# Altium footprint library Nanjar's Library.PcbLib: 153 footprints (part 7 of 10)
Each footprint in its own frame and in the unit in brackets; x right, y up, seen from the top. Pads: shape width x height; smd on the part's side, far side on the other; paste and mask are expansions set on the pad; w line width, h text height; cw(c..) or ccw(c..) is an arc to the next point about the centre after c.
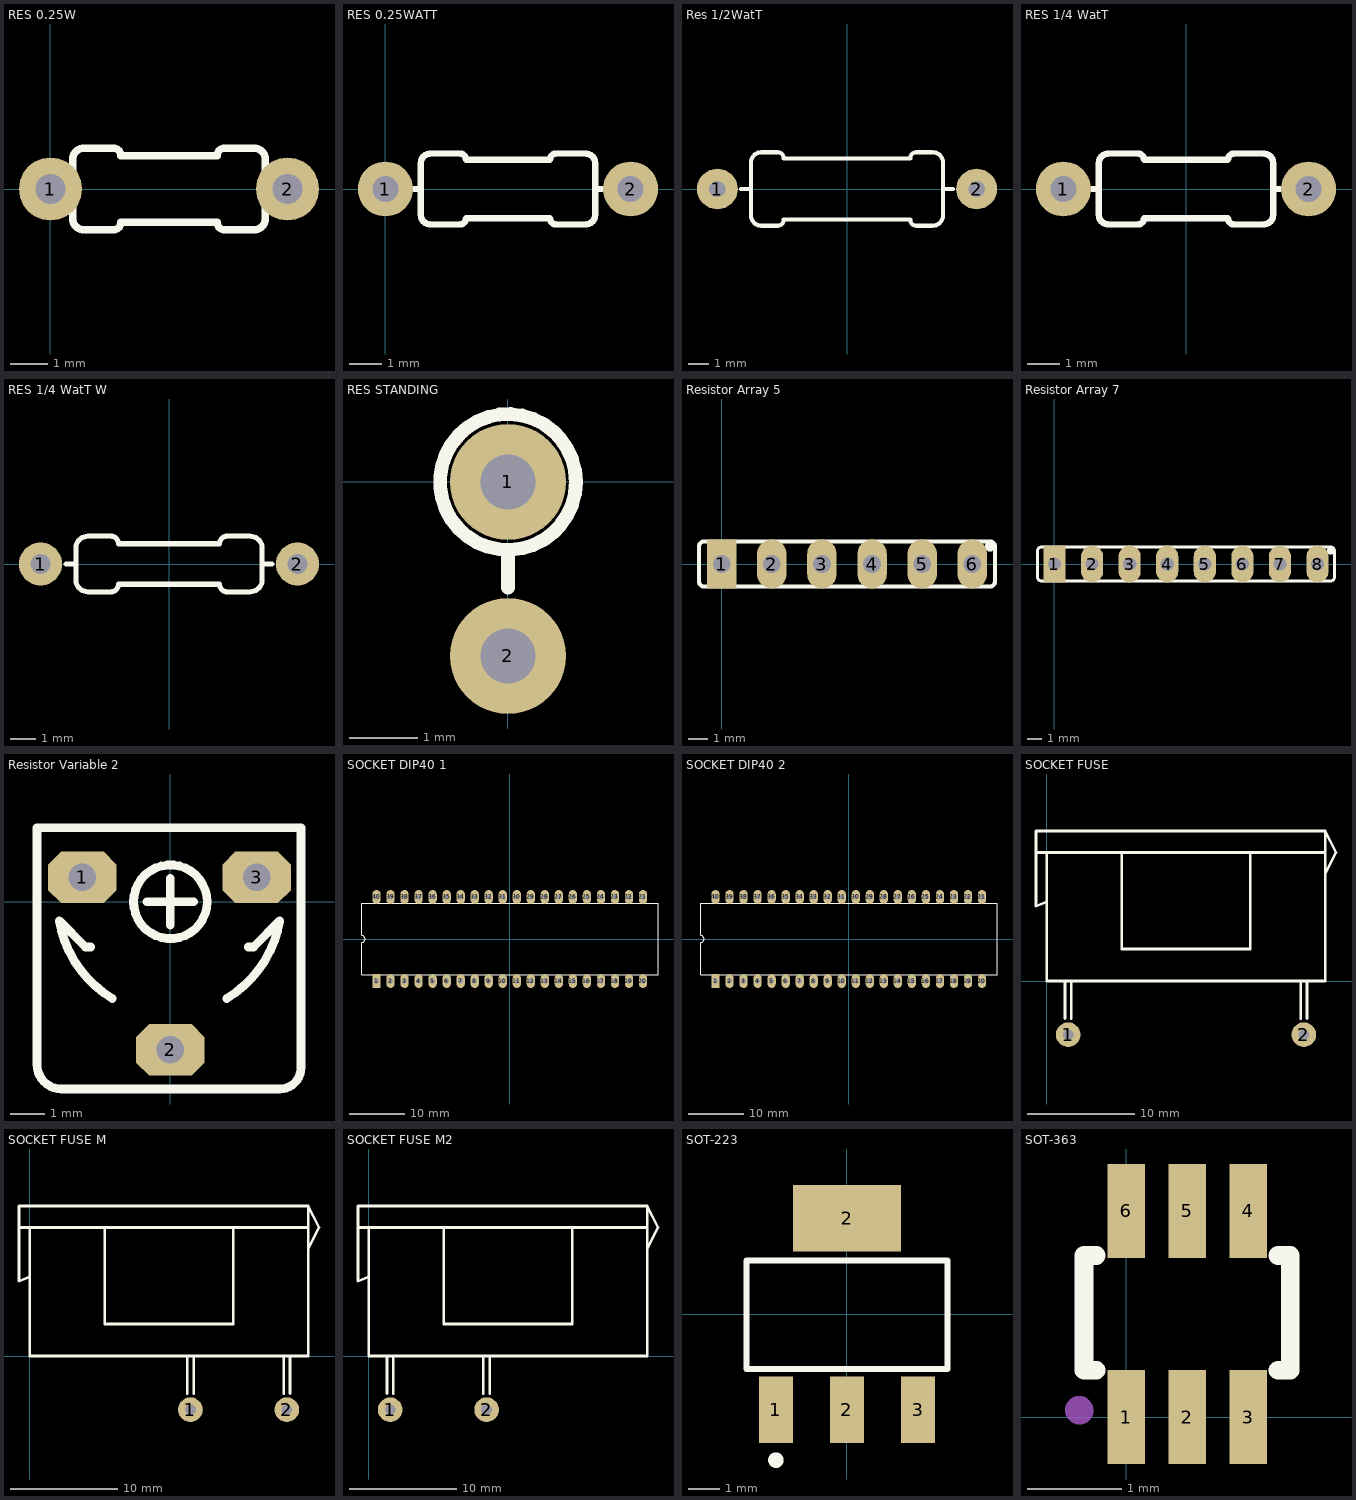
[diagram p6: the footprints below, top view; thin cyan lines are the x and y axes]

## RES 0.25W [mm]
pads (2):
  round 1.7 hole 0.8: 1(0,0) 2(6.4,0)
Top Overlay:
  lines w0.2: 0.4,0 0.6,0 ; 6,0 5.8,0 ; 0.6,0 0.6,-0.8 ccw(c0.9,-0.8) 0.9,-1.1 1.7,-1.1 ccw(c1.7,-0.9) 1.9,-0.9 3.2,-0.9 4.5,-0.9 ccw(c4.7,-0.9) 4.7,-1.1 5.5,-1.1 ccw(c5.5,-0.8) 5.8,-0.8 5.8,0 ; 0.6,0 0.6,0.8 cw(c0.9,0.8) 0.9,1.1 1.7,1.1 cw(c1.7,0.9) 1.9,0.9 3.2,0.9 4.5,0.9 cw(c4.7,0.9) 4.7,1.1 5.5,1.1 cw(c5.5,0.8) 5.8,0.8 5.8,0
3D body "SW3dPS-Res_Normal (0.25W).STEP": height 1.92, standoff -2, extent -0.229,-0.92 6.629,0.921

## RES 0.25WATT [mm]
pads (2):
  round 1.7 hole 0.8: 1(0,0) 2(7.6,0)
Top Overlay:
  lines w0.2: 1.1,0 0.9,0 1.1,0 ; 1.1,0 1.1,0.8 cw(c1.4,0.8) 1.4,1.1 2.3,1.1 cw(c2.3,0.9) 2.5,0.9 3.8,0.9 5.1,0.9 cw(c5.3,0.9) 5.3,1.1 6.2,1.1 cw(c6.2,0.8) 6.5,0.8 6.5,0 ; 1.1,0 1.1,-0.8 ccw(c1.4,-0.8) 1.4,-1.1 2.3,-1.1 ccw(c2.3,-0.9) 2.5,-0.9 3.8,-0.9 5.1,-0.9 ccw(c5.3,-0.9) 5.3,-1.1 6.2,-1.1 ccw(c6.2,-0.8) 6.5,-0.8 6.5,0 ; 6.5,0 6.7,0 6.5,0
3D body "Assem1.STEP": height 0, standoff 0, extent 0.585,-0.978 0.585,-0.978
3D body "My 0.25watt.step": height 2.43, standoff -2.14, extent -0.3,-1.15 7.9,1.15

## Res 1/2WatT [mm]
pads (2):
  round 2 hole 0.8: 1(-6.35,0) 2(6.35,0)
Top Overlay:
  lines w0.2: -4.7,0 -4.7,1.3 cw(c-4.2,1.3) -4.2,1.8 -3.4,1.8 cw(c-3.4,1.5) -3.1,1.5 0,1.5 3.1,1.5 cw(c3.4,1.5) 3.4,1.8 4.2,1.8 cw(c4.2,1.3) 4.7,1.3 4.7,0 ; -4.7,0 -5.2,0 -4.7,0 ; -4.7,0 -4.7,-1.3 ccw(c-4.2,-1.3) -4.2,-1.8 -3.4,-1.8 ccw(c-3.4,-1.5) -3.1,-1.5 0,-1.5 3.1,-1.5 ccw(c3.4,-1.5) 3.4,-1.8 4.2,-1.8 ccw(c4.2,-1.3) 4.7,-1.3 4.7,0 ; 4.7,0 5.2,0 4.7,0
3D body "User Library-Res50-Axial 0_5W-1_5M.step": height 3.78, standoff -5.6, extent -6.725,-1.875 6.725,1.875

## RES 1/4 WatT [mm]
pads (2):
  round 1.7 hole 0.8: 1(-3.8,0) 2(3.8,0)
Top Overlay:
  lines w0.2: -2.7,0 -2.9,0 -2.7,0 ; -2.7,0 -2.7,0.8 cw(c-2.4,0.8) -2.4,1.1 -1.5,1.1 cw(c-1.5,0.9) -1.3,0.9 0,0.9 1.3,0.9 cw(c1.5,0.9) 1.5,1.1 2.4,1.1 cw(c2.4,0.8) 2.7,0.8 2.7,0 ; -2.7,0 -2.7,-0.8 ccw(c-2.4,-0.8) -2.4,-1.1 -1.5,-1.1 ccw(c-1.5,-0.9) -1.3,-0.9 0,-0.9 1.3,-0.9 ccw(c1.5,-0.9) 1.5,-1.1 2.4,-1.1 ccw(c2.4,-0.8) 2.7,-0.8 2.7,0 ; 2.7,0 2.9,0 2.7,0
3D body "Assem1.STEP": height 0, standoff 0, extent -3.215,-0.978 -3.215,-0.978
3D body "User Library-res-7_62-0r.step": height 2.45, standoff -1.75, extent -4.1,-1.2 4.12,1.206

## RES 1/4 WatT W [mm]
pads (2):
  round 1.7 hole 0.8: 1(-5.08,0) 2(5.08,0)
Top Overlay:
  lines w0.2: -3.683,0 -4.064,0 -3.683,0 ; -3.683,0 -3.683,-0.635 ccw(c-3.209,-0.626) -3.2,-1.1 -2.3,-1.1 ccw(c-2.3,-0.8) -2,-0.8 0,-0.8 2,-0.8 ccw(c2.3,-0.8) 2.3,-1.1 3.2,-1.1 ccw(c3.209,-0.626) 3.683,-0.635 3.683,0 ; -3.683,0 -3.683,0.635 cw(c-3.209,0.626) -3.2,1.1 -2.3,1.1 cw(c-2.3,0.8) -2,0.8 0,0.8 2,0.8 cw(c2.3,0.8) 2.3,1.1 3.2,1.1 cw(c3.209,0.626) 3.683,0.635 3.683,0 ; 3.683,0 4.064,0 3.683,0
3D body "User Library-Res40-Axial 0_25W-1K.step": height 2.41, standoff -2, extent -5.38,-1.2 5.38,1.2
3D body "Assem1.STEP": height 0, standoff 0, extent -3.215,-0.978 -3.215,-0.978

## RES STANDING [mm]
pads (2):
  round 1.7 hole 0.8: 1(0,0) 2(0,-2.55)
Top Overlay:
  circle w0.2: c0,0 r0.996
  lines w0.2: 0,-1.55 0,-1.025
3D body "Widerstand.stp": height 8.06, standoff -3, extent -1.091,-2.789 1.1,1.098

## Resistor Array 5 [mm] "Connector; Header; 6 Position"
height 1.4
pads (6):
  rect 1.5x2.5 hole 0.9: 1(0,0)
  oval 1.5x2.5 hole 0.9: 2(2.54,0) 3(5.08,0) 4(7.62,0) 5(10.16,0) 6(12.7,0)
Top Overlay:
  circle w0.254: c13.589,0.889 r0.127
  lines w0.2: -1.143,-0.889 ccw(c-0.889,-0.889) -0.889,-1.143 13.589,-1.143 ccw(c13.589,-0.889) 13.843,-0.889 13.843,0.889 ccw(c13.589,0.889) 13.589,1.143 -0.889,1.143 ccw(c-0.889,0.889) -1.143,0.889 -1.143,-0.889
3D body "5R.step": height 5.99, standoff -2.59, extent -1.275,-1.225 13.961,1.275

## Resistor Array 7 [mm] "Connector; Header; 6 Position"
height 1.4
pads (8):
  rect 1.5x2.5 hole 0.9: 1(0,0)
  oval 1.5x2.5 hole 0.9: 2(2.54,0) 3(5.08,0) 4(7.62,0) 5(10.16,0) 6(12.7,0) 7(15.24,0) 8(17.78,0)
Top Overlay:
  circle w0.254: c18.669,0.889 r0.127
  lines w0.2: -1.143,-0.889 ccw(c-0.889,-0.889) -0.889,-1.143 18.669,-1.143 ccw(c18.669,-0.889) 18.923,-0.889 18.923,0.889 ccw(c18.669,0.889) 18.669,1.143 -0.889,1.143 ccw(c-0.889,0.889) -1.143,0.889 -1.143,-0.889
3D body "7R.step": height 5.89, standoff -2.69, extent -1.27,-1.25 19.046,1.25

## Resistor Variable 2 [mm] "Resistor Variable 2"
pads (3):
  oct 2x1.5 hole 0.8: 1(-2.563,0.71) 2(0,-4.318) 3(2.517,0.71)
Top Overlay:
  circle w0.254: c0.002,-0.001 r1.073
  lines w0.254: -2.322,-1.321 -2.475,-1.321 -3.24,-0.555 ccw(c0.002,-0.001) -1.693,-2.82 ; -0.686,-0.001 0.686,-0.001 ; 1.646,-2.82 ccw(c-0.049,-0.001) 3.193,-0.555 2.428,-1.321 2.275,-1.321 ; -3.886,-4.75 ccw(c-3.175,-4.75) -3.175,-5.461 3.193,-5.461 ccw(c3.193,-4.844) 3.81,-4.844 3.81,-4.445 3.81,-1.27 3.81,-0.381 3.81,2.159 3.556,2.159 -3.175,2.159 -3.683,2.159 -3.886,2.159 -3.886,-0.102 -3.886,-4.445 -3.886,-4.75 ; 0,-0.686 0,0.685 0,-0.686
3D body "User Library-Pot - RES_VAR1.step": height 7.4, standoff -3.5, extent -3.25,-5.145 3.25,1.905

## SOCKET DIP40 1 [mm] "DIP; 40 Leads; Row Spacing 15.24 mm; Pitch 2.54 mm"
height 5.72
pads (40):
  rect 1.5x2.5 hole 0.9: 1(-24.13,-7.62)
  oval 1.5x2.5 hole 0.9: 2(-21.59,-7.62) 3(-19.05,-7.62) 4(-16.51,-7.62) 5(-13.97,-7.62) 6(-11.43,-7.62) 7(-8.89,-7.62) 8(-6.35,-7.62) 9(-3.81,-7.62) 10(-1.27,-7.62) 11(1.27,-7.62) 12(3.81,-7.62) 13(6.35,-7.62) 14(8.89,-7.62) 15(11.43,-7.62) 16(13.97,-7.62) 17(16.51,-7.62) 18(19.05,-7.62) 19(21.59,-7.62) 20(24.13,-7.62) 21(24.13,7.62) 22(21.59,7.62) 23(19.05,7.62) 24(16.51,7.62) 25(13.97,7.62) 26(11.43,7.62) 27(8.89,7.62) 28(6.35,7.62) 29(3.81,7.62) 30(1.27,7.62) 31(-1.27,7.62) 32(-3.81,7.62) 33(-6.35,7.62) 34(-8.89,7.62) 35(-11.43,7.62) 36(-13.97,7.62) 37(-16.51,7.62) 38(-19.05,7.62) 39(-21.59,7.62) 40(-24.13,7.62)
Top Overlay:
  lines w0.2: -26.85,-6.45 26.85,-6.45 26.85,6.45 -26.85,6.45 -26.85,0.635 cw(c-26.85,0) -26.85,-0.635 -26.85,-6.45
3D body "User Library-40pin 0_6inch 2_54mm IC DIP Socket Round Hole.step": height 5.01, standoff -2.5, extent -25.42,-8.85 25.38,8.93

## SOCKET DIP40 2 [mm] "DIP; 40 Leads; Row Spacing 15.24 mm; Pitch 2.54 mm"
height 5.72
pads (40):
  rect 1.5x2.5 hole 0.9: 1(-24.13,-7.62)
  oval 1.5x2.5 hole 0.9: 2(-21.59,-7.62) 3(-19.05,-7.62) 4(-16.51,-7.62) 5(-13.97,-7.62) 6(-11.43,-7.62) 7(-8.89,-7.62) 8(-6.35,-7.62) 9(-3.81,-7.62) 10(-1.27,-7.62) 11(1.27,-7.62) 12(3.81,-7.62) 13(6.35,-7.62) 14(8.89,-7.62) 15(11.43,-7.62) 16(13.97,-7.62) 17(16.51,-7.62) 18(19.05,-7.62) 19(21.59,-7.62) 20(24.13,-7.62) 21(24.13,7.62) 22(21.59,7.62) 23(19.05,7.62) 24(16.51,7.62) 25(13.97,7.62) 26(11.43,7.62) 27(8.89,7.62) 28(6.35,7.62) 29(3.81,7.62) 30(1.27,7.62) 31(-1.27,7.62) 32(-3.81,7.62) 33(-6.35,7.62) 34(-8.89,7.62) 35(-11.43,7.62) 36(-13.97,7.62) 37(-16.51,7.62) 38(-19.05,7.62) 39(-21.59,7.62) 40(-24.13,7.62)
Top Overlay:
  lines w0.2: -26.85,-6.45 26.85,-6.45 26.85,6.45 -26.85,6.45 -26.85,0.635 cw(c-26.85,0) -26.85,-0.635 -26.85,-6.45
3D body "User Library-DIP40-600-1.step": height 4.8, standoff -3.5, extent -25.38,-8.8 25.32,8.8

## SOCKET FUSE [mm]
pads (2):
  round 2.3 hole 1 paste+0: 1(2,-5) 2(24,-5)
Top Overlay:
  lines w0.25: -1,12 7,12 ; 0,7.4 -1,7 -1,14 26,14 ; 0,12 0,8 0,7 0,0 26,0 26,10 ; 1.7,-3.5 1.7,0 ; 2.3,-3.5 2.3,0 ; 23.7,-3.5 23.7,0 ; 24.3,-3.5 24.3,0 ; 26,12 19,12 ; 7,12 7,3 19,3 19,12 ; 7,12 19,12 ; 26,10 27,12 26,14 ; 26,10 26,14

## SOCKET FUSE M [mm]
pads (2):
  round 2.3 hole 1 paste+0: 1(15,-5) 2(24,-5)
Top Overlay:
  lines w0.25: -1,12 7,12 ; 0,7.4 -1,7 -1,14 26,14 ; 0,12 0,8 0,7 0,0 26,0 26,10 ; 14.7,-3.5 14.7,0 ; 15.3,-3.5 15.3,0 ; 23.7,-3.5 23.7,0 ; 24.3,-3.5 24.3,0 ; 26,12 19,12 ; 7,12 7,3 19,3 19,12 ; 7,12 19,12 ; 26,10 27,12 26,14 ; 26,10 26,14

## SOCKET FUSE M2 [mm]
pads (2):
  round 2.3 hole 1 paste+0: 1(2,-5) 2(11,-5)
Top Overlay:
  lines w0.25: -1,12 7,12 ; 0,7.4 -1,7 -1,14 26,14 ; 0,12 0,8 0,7 0,0 26,0 26,10 ; 1.7,-3.5 1.7,0 ; 2.3,-3.5 2.3,0 ; 10.7,-3.5 10.7,0 ; 11.3,-3.5 11.3,0 ; 26,12 19,12 ; 7,12 19,12 ; 7,12 7,3 19,3 19,12 ; 26,10 26,14 ; 26,10 27,12 26,14

## SOT-223 [mm] "SOT-223/SC-73; 4 Leads; Body 6.7 x 7.3 mm, inc. leads (LxW max)"
height 1.8
pads (4):
  rect 1.1x2.15 smd: 1(-2.3,-3.1) 2(0,-3.1) 3(2.3,-3.1)
  rect 3.5x2.15 smd: 2(0,3.1)
Top Overlay:
  circle w0.25: c-2.3,-4.725 r0.125
  lines w0.2: -3.25,-1.775 -3.25,1.725 3.25,1.725 3.25,-1.775 -3.25,-1.775
3D body "SOT-223.STEP": height 1.64, standoff -0.01, extent -3.25,-3.51 3.25,3.49

## SOT-363 [mm]
pads (6):
  rect 0.4x1 smd: 1(0,0) 2(0.65,0) 3(1.3,0) 4(1.3,2.2) 5(0.65,2.2) 6(0,2.2)
Top Overlay:
  lines w0.2: -0.32,0.5 -0.45,0.5 -0.45,1.725 -0.32,1.725 ; 1.62,0.5 1.75,0.5 1.75,1.725 1.62,1.725
Mechanical 16:
  lines w0.254: -0.491,0.098 ccw(c-0.5,0.075) -0.475,0.075
3D body "User Library-sot363.step": height 1, standoff 0, extent -0.4,-0.05 1.7,2.25